# Altium footprint library Connektor.PcbLib: 305 footprints (part 19 of 20)
Each footprint in its own frame and in the unit in brackets; x right, y up, seen from the top. Pads: shape width x height; smd on the part's side, far side on the other; paste and mask are expansions set on the pad; w line width, h text height; cw(c..) or ccw(c..) is an arc to the next point about the centre after c.
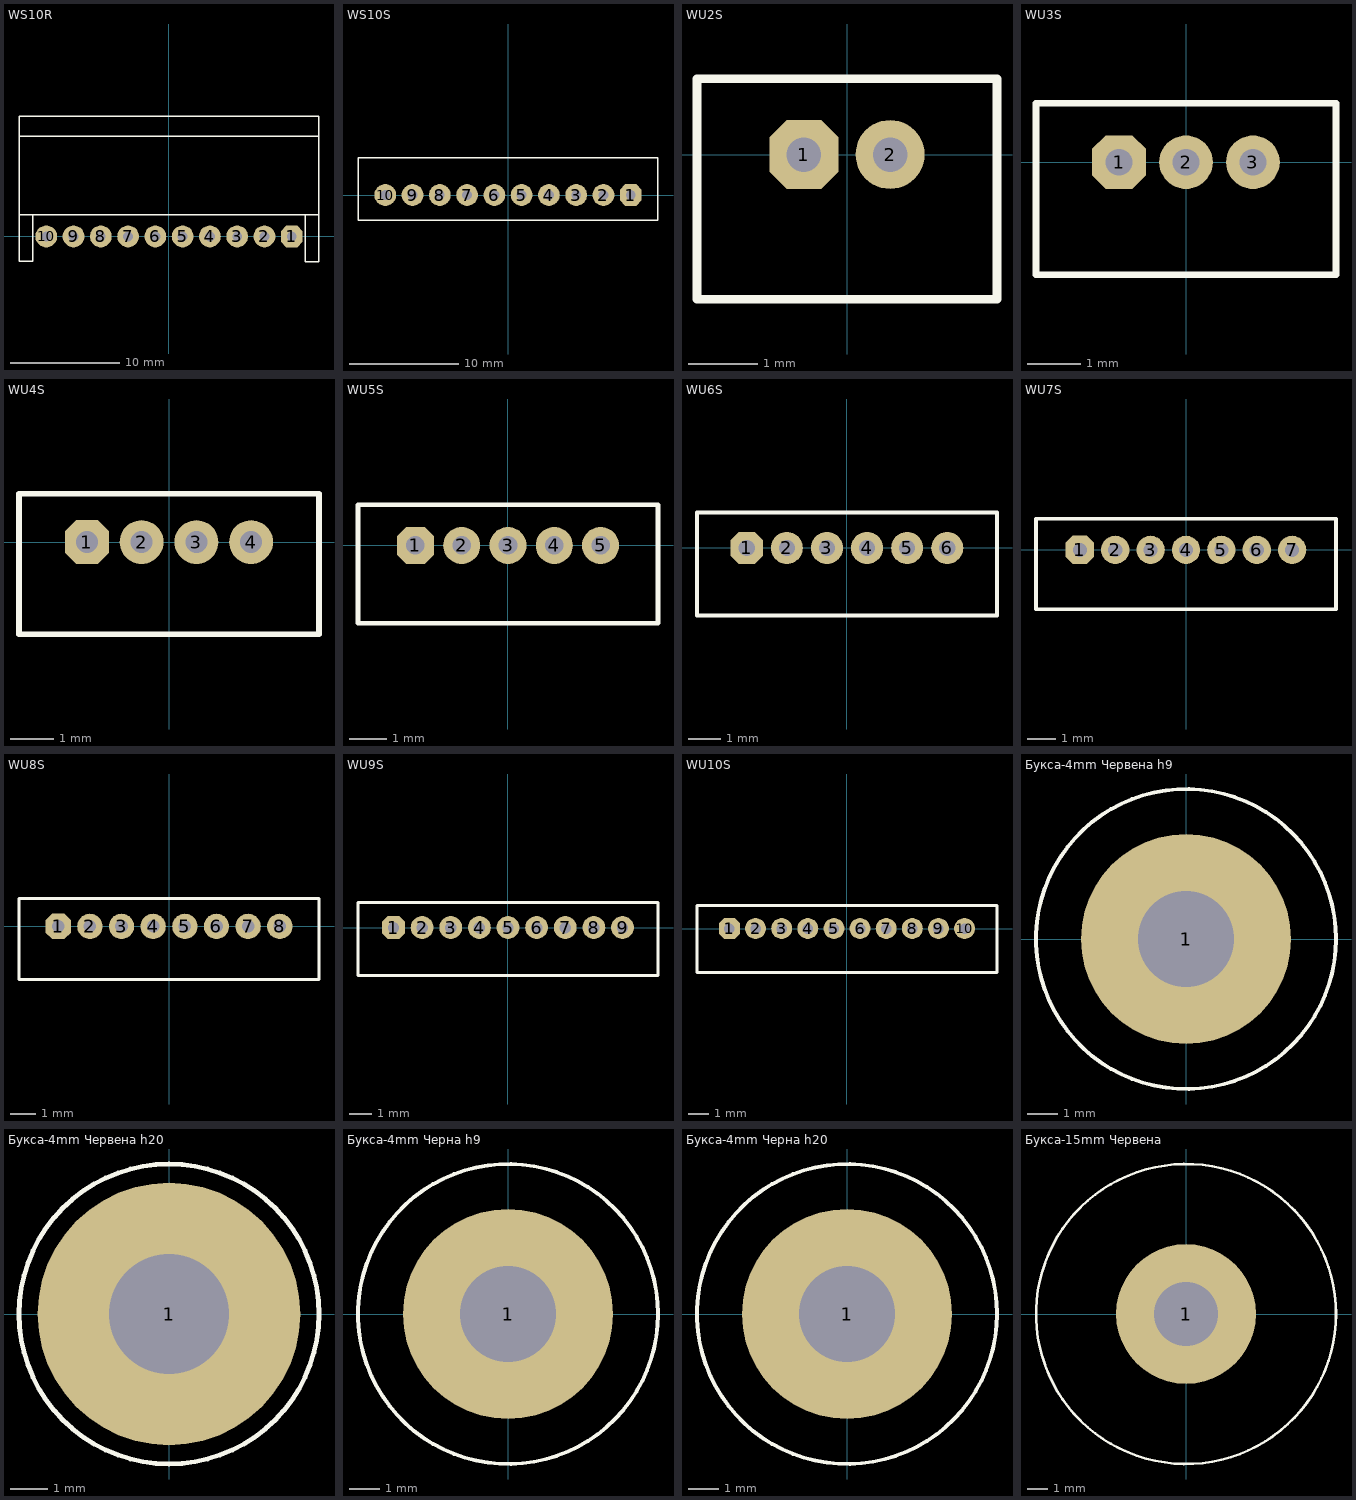
[diagram p18: the footprints below, top view; thin cyan lines are the x and y axes]

## WS10R [mm]
pads (10):
  oct 2x2 hole 0.9: 1(11.25,0)
  round 2 hole 0.9: 2(8.75,0) 3(6.25,0) 4(3.75,0) 5(1.25,0) 6(-1.25,0) 7(-3.75,0) 8(-6.25,0) 9(-8.75,0) 10(-11.25,0)
TopOverlay:
  lines w0.127: -13.75,2 13.75,2 ; -13.75,9.2 13.7,9.2 ; -12.5,2 -12.5,-2.25 -13.75,-2.25 -13.75,11 13.75,11 13.75,-2.3 12.5,-2.3 12.5,2
3D body: height 6.1, standoff -2, extent -13.7,-2.3 13.7,9.2

## WS10S [mm]
pads (10):
  oct 2x2 hole 0.9: 1(11.25,0)
  round 2 hole 0.9: 2(8.75,0) 3(6.25,0) 4(3.75,0) 5(1.25,0) 6(-1.25,0) 7(-3.75,0) 8(-6.25,0) 9(-8.75,0) 10(-11.25,0)
TopOverlay:
  lines w0.127: -13.75,-2.3 13.75,-2.3 13.75,3.4 -13.75,3.4 -13.75,-2.3
3D body: height 7.7, standoff -2.5, extent -13.8,-2.3 13.8,3.4

## WU2S [mm]
pads (2):
  oct 1x1 hole 0.5: 1(-0.625,0)
  round 1 hole 0.5: 2(0.625,0)
TopOverlay:
  lines w0.127: -2.175,-2.1 -2.175,1.1 2.175,1.1 2.175,-2.1 -2.175,-2.1

## WU3S [mm]
pads (3):
  oct 1x1 hole 0.5: 1(-1.25,0)
  round 1 hole 0.5: 2(0,0) 3(1.25,0)
TopOverlay:
  lines w0.127: -2.8,-2.1 -2.8,1.1 2.8,1.1 2.8,-2.1 -2.8,-2.1

## WU4S [mm]
pads (4):
  oct 1x1 hole 0.5: 1(-1.875,0)
  round 1 hole 0.5: 2(-0.625,0) 3(0.625,0) 4(1.875,0)
TopOverlay:
  lines w0.127: -3.425,-2.1 3.425,-2.1 3.425,1.1 -3.425,1.1 -3.425,-2.1

## WU5S [mm]
pads (5):
  oct 1x1 hole 0.5: 1(-2.5,0)
  round 1 hole 0.5: 2(-1.25,0) 3(0,0) 4(1.25,0) 5(2.5,0)
TopOverlay:
  lines w0.127: -4.05,-2.1 -4.05,1.1 4.05,1.1 4.05,-2.1 -4.05,-2.1

## WU6S [mm]
pads (6):
  oct 1x1 hole 0.5: 1(-3.125,0)
  round 1 hole 0.5: 2(-1.875,0) 3(-0.625,0) 4(0.625,0) 5(1.875,0) 6(3.125,0)
TopOverlay:
  lines w0.127: -4.675,-2.1 -4.675,1.1 4.675,1.1 4.675,-2.1 -4.675,-2.1

## WU7S [mm]
pads (7):
  oct 1x1 hole 0.5: 1(-3.75,0)
  round 1 hole 0.5: 2(-2.5,0) 3(-1.25,0) 4(0,0) 5(1.25,0) 6(2.5,0) 7(3.75,0)
TopOverlay:
  lines w0.127: -5.3,-2.1 -5.3,1.1 5.3,1.1 5.3,-2.1 -5.3,-2.1

## WU8S [mm]
pads (8):
  oct 1x1 hole 0.5: 1(-4.375,0)
  round 1 hole 0.5: 2(-3.125,0) 3(-1.875,0) 4(-0.625,0) 5(0.625,0) 6(1.875,0) 7(3.125,0) 8(4.375,0)
TopOverlay:
  lines w0.127: -5.925,-2.1 -5.925,1.1 5.925,1.1 5.925,-2.1 -5.925,-2.1

## WU9S [mm]
pads (9):
  oct 1x1 hole 0.5: 1(-5,0)
  round 1 hole 0.5: 2(-3.75,0) 3(-2.5,0) 4(-1.25,0) 5(0,0) 6(1.25,0) 7(2.5,0) 8(3.75,0) 9(5,0)
TopOverlay:
  lines w0.127: -6.55,-2.1 -6.55,1.1 6.55,1.1 6.55,-2.1 -6.55,-2.1

## WU10S [mm]
pads (10):
  oct 1x1 hole 0.5: 1(-5.625,0)
  round 1 hole 0.5: 2(-4.375,0) 3(-3.125,0) 4(-1.875,0) 5(-0.625,0) 6(0.625,0) 7(1.875,0) 8(3.125,0) 9(4.375,0) 10(5.625,0)
TopOverlay:
  lines w0.127: -7.175,-2.1 7.175,-2.1 7.175,1.1 -7.175,1.1 -7.175,-2.1

## Букса-4mm Червена h9 [mm]
pads (1):
  round 7 hole 3.2: 1(0,0)
TopOverlay:
  circle w0.127: c0,0 r5
3D body: height 10, standoff -13, extent -3,-3 3,3
3D body: height 2.25, standoff 0.75, extent -4.619,-4 4.619,4
3D body: height 7, standoff 2, extent -5,-5 5,5
3D body: height 14, standoff 6, extent -5,-5 5,5

## Букса-4mm Червена h20 [mm]
pads (1):
  round 7 hole 3.2: 1(0,0)
TopOverlay:
  circle w0.127: c0,0 r4
3D body: height 25, standoff 17, extent -5,-5 5,5
3D body: height 17, standoff 12, extent -5,-5 5,5
3D body: height 3.75, standoff 2.25, extent -4.619,-4 4.619,4
3D body: height 20, standoff -3, extent -3,-3 3,3

## Букса-4mm Черна h9 [mm]
pads (1):
  round 7 hole 3.2: 1(0,0)
TopOverlay:
  circle w0.127: c0,0 r5
3D body: height 10, standoff -13, extent -3,-3 3,3
3D body: height 2.25, standoff 0.75, extent -4.619,-4 4.619,4
3D body: height 7, standoff 2, extent -5,-5 5,5
3D body: height 14, standoff 6, extent -5,-5 5,5

## Букса-4mm Черна h20 [mm]
pads (1):
  round 7 hole 3.2: 1(0,0)
TopOverlay:
  circle w0.127: c0,0 r5
3D body: height 20, standoff -3, extent -3,-3 3,3
3D body: height 3.75, standoff 2.25, extent -4.619,-4 4.619,4
3D body: height 17, standoff 12, extent -5,-5 5,5
3D body: height 25, standoff 17, extent -5,-5 5,5

## Букса-15mm Червена [mm]
pads (1):
  round 7 hole 3.2: 1(0,0)
TopOverlay:
  circle w0.127: c0,0 r7.5
3D body: height 28.5, standoff 15.5, extent -7.5,-7.5 7.5,7.5
3D body: height 27.7, standoff 4.5, extent -4,-4 4,4